# Altium footprint library MyPcbLib.PcbLib: 65 footprints (part 3 of 5)
Each footprint in its own frame and in the unit in brackets; x right, y up, seen from the top. Pads: shape width x height; smd on the part's side, far side on the other; paste and mask are expansions set on the pad; w line width, h text height; cw(c..) or ccw(c..) is an arc to the next point about the centre after c.
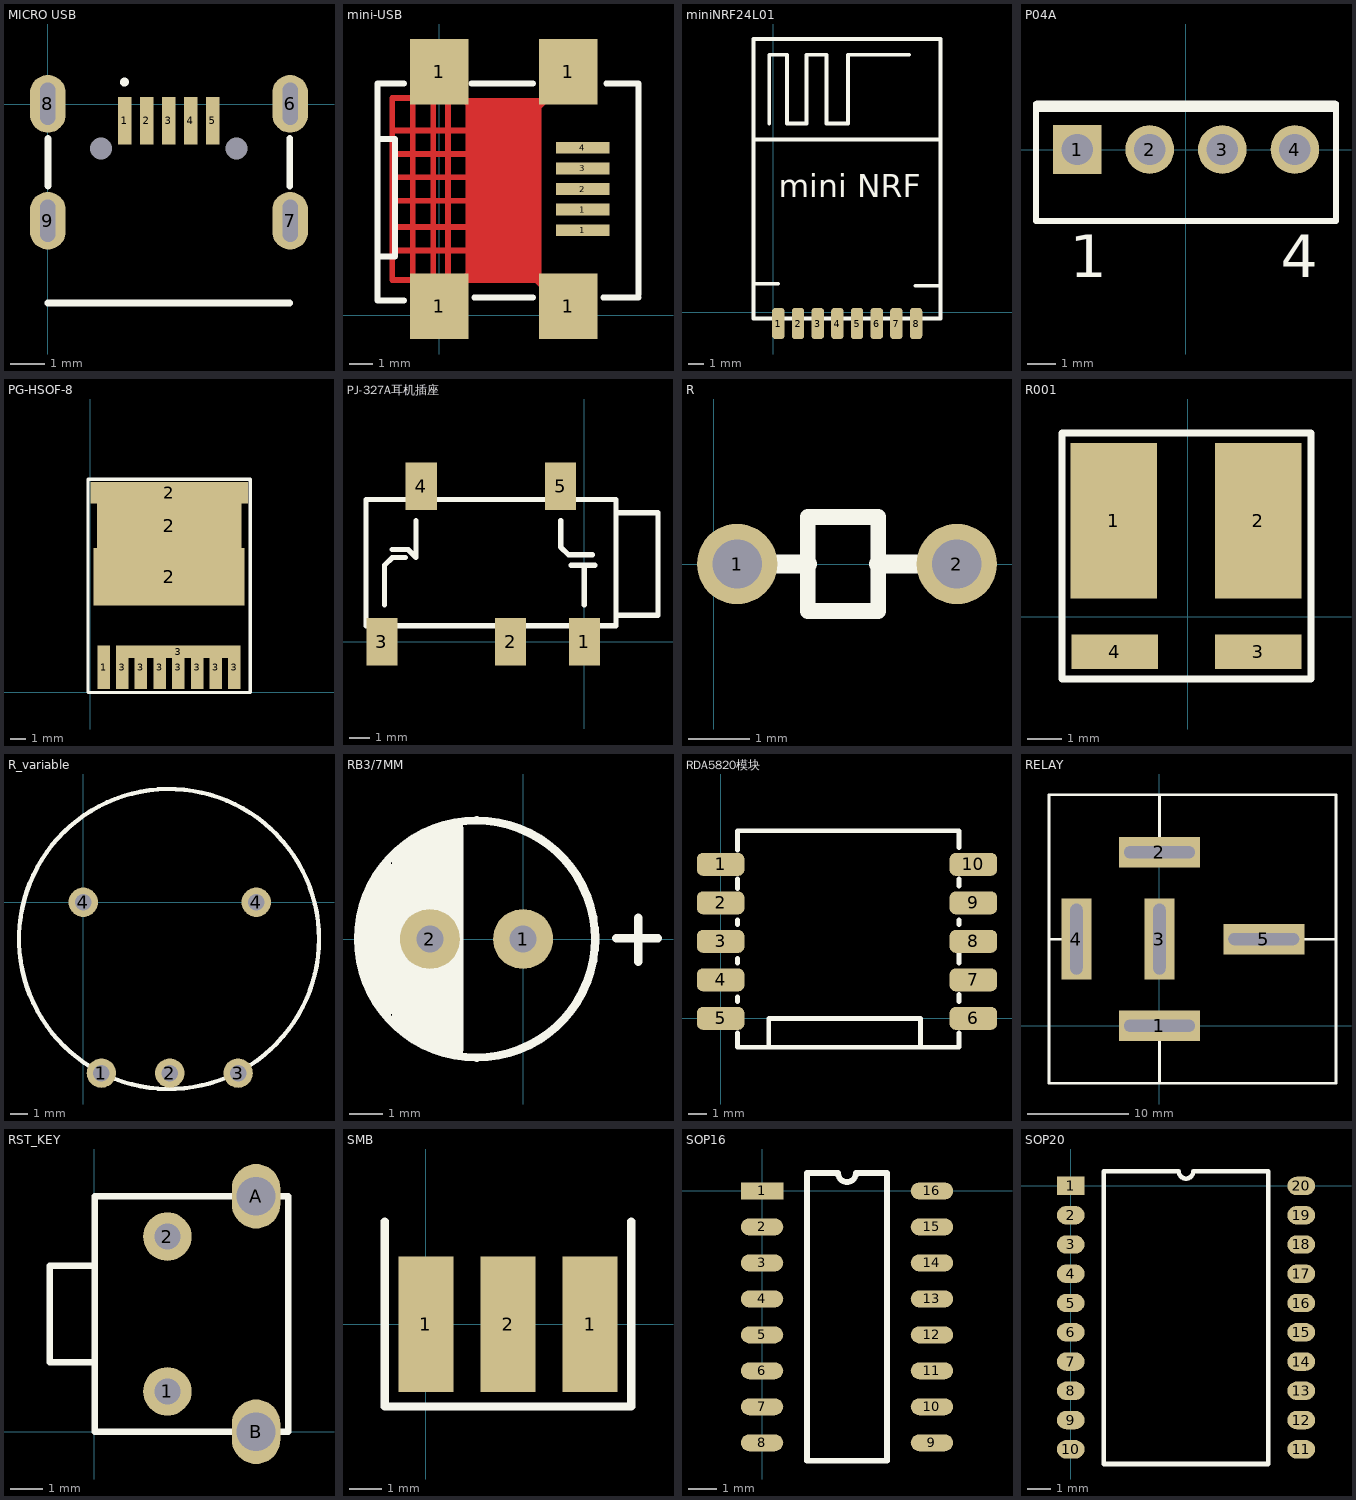
[diagram p2: the footprints below, top view; thin cyan lines are the x and y axes]

## MICRO USB [mm]
pads (11):
  rect 0.4x1.4 smd: 1(2.265,-0.49) 2(2.915,-0.49) 3(3.565,-0.49) 4(4.215,-0.49) 5(4.865,-0.49)
  oval 1.05x1.7 hole 0.45 slot 1.25 at 90 deg: 6(7.15,0.01) 7(7.15,-3.44) 8(0,0.01) 9(0,-3.44)
  round 0.3 hole 0.65: MH1(1.565,-1.315) MH2(5.565,-1.315)
Top Overlay:
  circle w0.254: c2.259,0.648 r0.006
  lines w0.203: -0.003,-5.867 7.137,-5.867 ; 0,-2.413 0,-1.016 ; 7.137,-2.413 7.137,-1.016

## mini-USB [mil]
pads (9):
  rect 100x111.81 smd: 1(0,15) 1(0,415) 1(220,15) 1(220,415)
  rect 90.55x19.68 smd: 1(245,145) 1(245,180) 2(245,215) 3(245,250) 4(245,285)
Top Layer:
  rectangle: 45,55 175,370
  lines w10: -80,110 55,110 55,150 -80,150 ; -80,195 55,195 55,235 -80,235 ; -80,275 50,275 55,270 55,310 50,315 -80,315 ; 15,375 15,65 -10,65 -10,370 -45,370 ; 30,50 70,90 80,90 ; 30,380 65,345 160,345 ; 150,85 150,75 195,30 ; 150,335 195,380 195,385 ; -45,370 -45,60 -80,60 -80,370 -45,370
Top Overlay:
  lines w10: -105,100 -75,100 -75,300 -105,300 ; -60,25 -105,25 -105,395 -60,395 ; 55,395 160,395 ; 60,30 160,30 ; 280,30 340,30 ; 285,395 340,395 ; 340,35 340,126.25 ; 340,122.5 340,305 ; 340,300 340,391.25

## miniNRF24L01 [mm]
pads (8):
  rrect50% 0.8x2 smd: 1(0.33,-0.711) 2(1.6,-0.711) 3(2.87,-0.711) 4(4.14,-0.711) 5(5.41,-0.711) 6(6.68,-0.711) 7(7.95,-0.711) 8(9.22,-0.711)
Top Overlay:
  lines w0.254: -1.27,1.854 0.305,1.854 ; -1.27,11.176 10.795,11.176 ; -0.254,12.192 -0.254,16.637 0.889,16.637 0.889,12.192 2.159,12.192 2.159,16.637 3.429,16.637 3.429,12.192 4.826,12.192 4.826,16.637 8.763,16.637 ; 9.195,1.727 10.795,1.727 ; -1.27,-0.381 -1.27,17.653 10.795,17.653 10.795,-0.381 -1.27,-0.381
  text "mini NRF" at 0.356,6.96 h2.52

## P04A [mm] "TO, Thru-Hole, Vertical, Heatsink Mounted; 4 In-Line Leads; Pitch 2.54 mm"
height 20.6
pads (4):
  rect 1.7x1.7 hole 1.1: 1(-3.81,0)
  round 1.7 hole 1.1: 2(-1.27,0) 3(1.27,0) 4(3.81,0)
Top Overlay:
  rectangle: -5.25,1.311 5.25,1.711
  lines w0.2: -5.25,1.6 -5.25,-2.5 5.25,-2.5 5.25,1.6
  text "1" at -4.06,-4.475 h1.5
  text "4" at 3.31,-4.475 h1.5

## PG-HSOF-8 [mm] "PG-HSOF-8"
pads (12):
  rect 0.8x2.8 smd: 1(0.838,1.626) 3(2.039,1.626) 3(3.24,1.626) 3(4.441,1.626) 3(5.642,1.626) 3(6.843,1.626) 3(8.045,1.626) 3(9.246,1.626)
  rect 9.7x3.7 smd: 2(5.055,7.417)
  rect 9.3x2.9 smd: 2(5.055,10.693)
  rect 10.1x1.4 smd: 2(5.055,12.827)
  rect 8x0.8 smd: 3(5.639,2.616)
Top Overlay:
  lines w0.2: -0.152,0 -0.152,13.691 10.262,13.691 10.262,0 -0.152,0

## PJ-327A耳机插座 [mm]
pads (5):
  rect 1.5x2.3 smd: 1(0,0) 2(-3.556,0) 3(-9.779,0) 4(-7.874,7.493) 5(-1.143,7.493)
Top Overlay:
  lines w0.254: -9.652,1.778 -9.652,3.683 -9.271,4.064 -8.636,4.064 ; -9.271,4.445 -8.509,4.445 -8.128,4.064 -8.128,5.842 ; -1.143,5.842 -1.143,4.572 -0.762,4.191 0.381,4.191 ; -0.635,3.683 0.508,3.683 ; 0,1.778 0,3.683 ; 1.524,1.27 3.556,1.27 3.556,6.223 1.524,6.223 ; -10.541,6.858 -10.541,0.762 1.524,0.762 1.524,6.858 ; -10.541,6.858 1.524,6.858 ; -10.541,6.858 1.524,6.858

## R [mm]
pads (2):
  round 1.3 hole 0.8: 1(0.381,0) 2(3.937,0)
Top Overlay:
  lines w0.254: 1.524,-0.762 1.524,0.762 2.667,0.762 2.667,-0.762 1.524,-0.762
  lines w0.305: 0.762,0 1.524,0 ; 2.667,0 3.556,0

## R001 [mm] "锰铜采样电阻"
pads (4):
  rect 2.5x4.5 smd: 1(-2.134,2.769) 2(2.032,2.769)
  rect 2.5x1 smd: 3(2.032,-1.016) 4(-2.108,-1.016)
Top Overlay:
  lines w0.2: -3.632,-1.803 -3.632,5.309 3.556,5.309 3.556,-1.803 -3.632,-1.803
3D body "WSLP2726 (0.0005).stp": height 1.51, standoff -1.44, extent -3.501,-1.6 3.399,5

## R_variable [mil]
pads (5):
  round 67.87 hole 37.87: 1(42,-395) 2(200,-395) 3(358,-395) 4(0,0) 4(400,0)
Top Overlay:
  circle w10: c198.23,-85 r346.77

## RB3/7MM [mm]
pads (2):
  round 1.8 hole 0.8: 1(0,0) 2(-2.794,0)
Top Overlay:
  circle w0.254: c-1.397,0 r3.556
  lines w0.254: -3.81,-2.54 -3.81,2.54 ; -3.556,-2.794 -3.556,2.794 ; -3.048,-3.048 -3.048,3.048 ; -2.286,-3.302 -2.286,3.302 ; 2.794,0.016 4.048,0.016 ; 3.454,-0.686 3.454,0.635
  lines w0.3: -4.826,-0.762 -4.826,0.762 ; -4.572,-1.524 -4.572,1.524 ; -4.318,-1.778 -4.318,1.778 ; -2.54,-3.302 -2.54,3.302
  lines w0.5: -4.064,-2.032 -4.064,2.032 ; -3.302,-2.794 -3.302,2.794 ; -2.794,-3.048 -2.794,3.048 ; -2.032,-3.302 -2.032,3.302

## RDA5820模块 [mm]
pads (10):
  rrect50% 2.5x1.2 smd: 1(0,8.128) 2(0,6.096) 3(0,4.064) 4(0,2.032) 5(0,0) 6(13.335,0) 7(13.335,2.032) 8(13.335,4.064) 9(13.335,6.096) 10(13.335,8.128)
Top Overlay:
  lines w0.254: 0.889,-0.762 0.889,-1.524 12.573,-1.524 12.573,-0.762 ; 0.889,0.889 0.889,1.143 ; 0.889,2.921 0.889,3.175 ; 0.889,4.953 0.889,5.207 ; 0.889,6.858 0.889,7.366 ; 0.889,8.89 0.889,9.906 12.573,9.906 12.573,9.017 ; 2.54,-1.524 2.54,0 10.541,0 10.541,-1.524 ; 12.573,0.889 12.573,1.27 ; 12.573,2.921 12.573,3.429 ; 12.573,4.953 12.573,5.207 ; 12.573,6.985 12.573,7.366

## RELAY [mm]
pads (5):
  rect 8x3 hole 1.2 slot 7 at 0 deg: 1(0,0) 2(0,17.145) 5(10.312,8.56)
  rect 3x8 hole 1.2 slot 7 at 90 deg: 3(0,8.56) 4(-8.204,8.56)
Top Overlay:
  lines w0.254: -10.922,8.56 -8.204,8.56 ; 0,-5.696 0,0 ; 0,17.145 0,22.841 ; 10.312,8.56 17.45,8.56 ; 0,22.841 -10.922,22.841 -10.922,-5.696 17.45,-5.696 17.45,22.841 0,22.841

## RST_KEY [mm]
pads (4):
  round 1.5 hole 0.8: 1(2.272,1.254) 2(2.272,6.054)
  oval 1.5x2 hole 1.2: A(5.022,7.304) B(5.022,0.004)
Top Overlay:
  lines w0.2: 0.022,2.154 -1.378,2.154 -1.378,5.154 0.022,5.154 ; 0.022,0.004 0.022,7.304 6.022,7.304 6.022,0.004 0.022,0.004

## SMB [mm]
pads (3):
  rect 1.7x4.2 smd: 1(0,0) 1(5.08,0) 2(2.54,0)
Top Overlay:
  lines w0.254: -1.27,3.175 -1.27,-2.54 6.35,-2.54 6.35,3.175

## SOP16 [mm]
pads (16):
  rect 1.5x0.6 smd: 1(0,0)
  oval 1.5x0.6 smd: 2(0,-1.27) 3(0,-2.54) 4(0,-3.81) 5(0,-5.08) 6(0,-6.35) 7(0,-7.62) 8(0,-8.89) 9(6,-8.89) 10(6,-7.62) 11(6,-6.35) 12(6,-5.08) 13(6,-3.81) 14(6,-2.54) 15(6,-1.27) 16(6,0)
Top Overlay:
  lines w0.2: 1.585,-9.525 4.415,-9.525 4.415,0.635 3.317,0.635 cw(c3,0.635) 2.682,0.635 1.585,0.635 1.585,-9.525

## SOP20 [mm]
pads (20):
  rect 1.2x0.8 smd: 1(0,0)
  oval 1.2x0.8 smd: 2(0,-1.27) 3(0,-2.54) 4(0,-3.81) 5(0,-5.08) 6(0,-6.35) 7(0,-7.62) 8(0,-8.89) 9(0,-10.16) 10(0,-11.43) 11(10,-11.43) 12(10,-10.16) 13(10,-8.89) 14(10,-7.62) 15(10,-6.35) 16(10,-5.08) 17(10,-3.81) 18(10,-2.54) 19(10,-1.27) 20(10,0)
Top Overlay:
  lines w0.2: 1.435,-12.065 1.435,0.635 4.683,0.635 ccw(c5,0.635) 5.318,0.635 8.565,0.635 8.565,-12.065 1.435,-12.065